# Altium footprint library CONNECTOR.PcbLib: 169 footprints (part 6 of 11)
Each footprint in its own frame and in the unit in brackets; x right, y up, seen from the top. Pads: shape width x height; smd on the part's side, far side on the other; paste and mask are expansions set on the pad; w line width, h text height; cw(c..) or ccw(c..) is an arc to the next point about the centre after c.
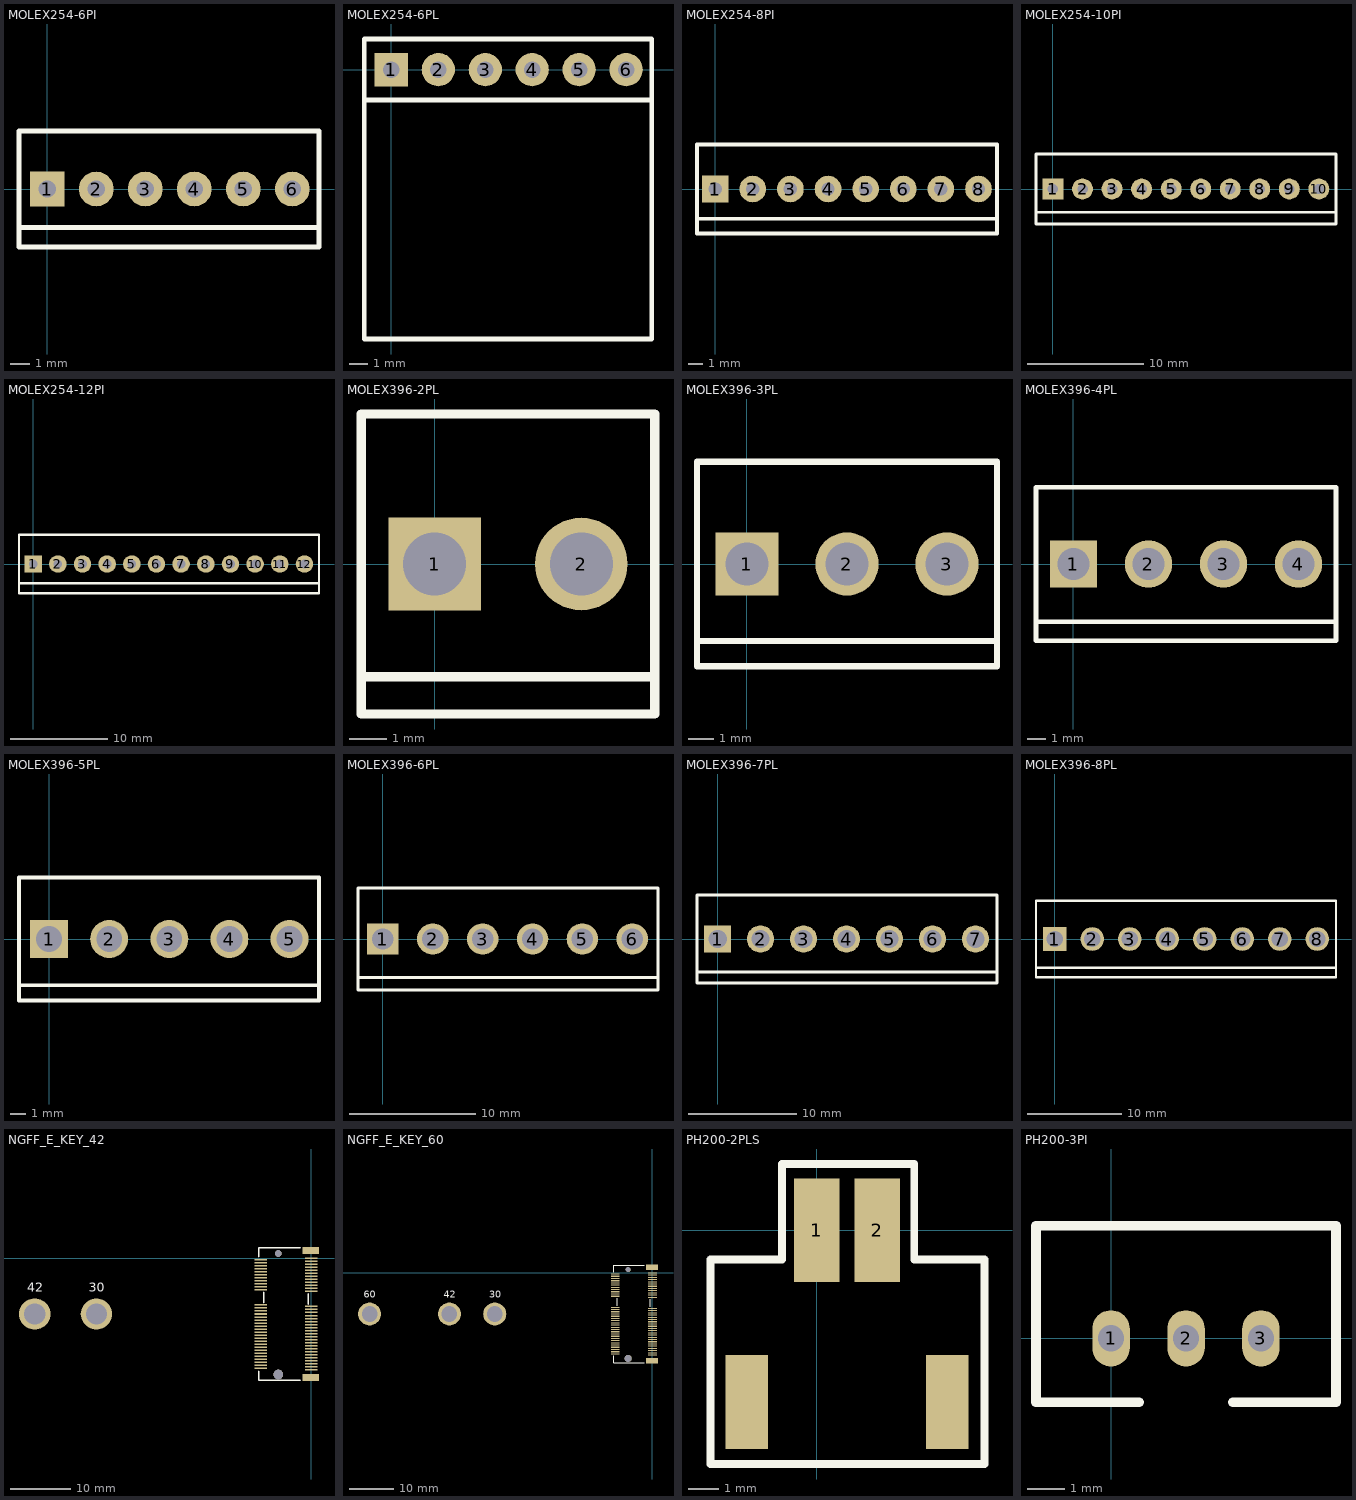
[diagram p5: the footprints below, top view; thin cyan lines are the x and y axes]

## MOLEX254-6PI [mm]
pads (6):
  rect 1.8x1.8 hole 0.9: 1(0,0)
  round 1.8 hole 0.9: 2(2.54,0) 3(5.08,0) 4(7.62,0) 5(10.16,0) 6(12.7,0)
Top Overlay:
  lines w0.25: -1.46,-2 14.08,-2 ; -1.46,-3 14.08,-3 14.08,3 -1.46,3 -1.46,-3
3D body "4384.stp": height 12.12, standoff -3.14, extent -1.251,-2.876 13.989,2.924

## MOLEX254-6PL [mm]
pads (6):
  rect 1.8x1.8 hole 0.9: 1(0,0.002)
  round 1.8 hole 0.9: 2(2.54,0.002) 3(5.08,0.002) 4(7.62,0.002) 5(10.16,0.002) 6(12.7,0.002)
Top Overlay:
  lines w0.25: -1.46,-1.641 14.08,-1.641 ; -1.46,-14.57 -1.46,1.659 14.08,1.659 14.08,-14.57 -1.46,-14.57
3D body "4310.stp": height 5.87, standoff -3.77, extent -1.298,-14.425 13.942,0.313

## MOLEX254-8PI [mm]
pads (8):
  rect 1.8x1.8 hole 0.9: 1(0,0)
  round 1.8 hole 0.9: 2(2.54,0) 3(5.08,0) 4(7.62,0) 5(10.16,0) 6(12.7,0) 7(15.24,0) 8(17.78,0)
Top Overlay:
  lines w0.25: -1.212,-2 19.024,-2 ; -1.227,-3 19.027,-3 19.027,3 -1.227,3 -1.227,-3
3D body "4386.stp": height 11.12, standoff -4.14, extent -1.279,-2.879 19.041,2.921

## MOLEX254-10PI [mm]
pads (10):
  rect 1.8x1.8 hole 0.9: 1(0,0)
  round 1.8 hole 0.9: 2(2.54,0) 3(5.08,0) 4(7.62,0) 5(10.16,0) 6(12.7,0) 7(15.24,0) 8(17.78,0) 9(20.32,0) 10(22.86,0)
Top Overlay:
  lines w0.25: -1.46,-2 24.333,-2 ; 24.282,3 -1.46,3 -1.46,-3 24.333,-3 24.333,3
3D body "4388.stp": height 12.12, standoff -3.14, extent -1.29,-2.924 24.11,2.876

## MOLEX254-12PI [mm]
pads (12):
  rect 1.8x1.8 hole 0.9: 1(0,0)
  round 1.8 hole 0.9: 2(2.54,0) 3(5.08,0) 4(7.62,0) 5(10.16,0) 6(12.7,0) 7(15.24,0) 8(17.78,0) 9(20.32,0) 10(22.86,0) 11(25.4,0) 12(27.94,0)
Top Overlay:
  lines w0.25: -1.397,-2 29.413,-2 ; -1.46,-3 29.439,-3 29.439,3 -1.46,3 -1.46,-3
3D body "4390.stp": height 12.12, standoff -3.14, extent -1.263,-2.883 29.217,2.917

## MOLEX396-2PL [mm]
pads (2):
  rect 2.5x2.5 hole 1.7: 1(0,0)
  round 2.5 hole 1.7: 2(3.96,0)
Top Overlay:
  lines w0.254: -1.98,-3.048 5.941,-3.048 ; -1.98,-4.05 5.94,-4.05 5.94,4.05 -1.98,4.05 -1.98,-4.05
3D body "41791-0832.stp": height 14.83, standoff -3.46, extent -1.963,-4.887 5.809,5.121

## MOLEX396-3PL [mm]
pads (3):
  rect 2.5x2.5 hole 1.7: 1(0,0)
  round 2.5 hole 1.7: 2(3.96,0) 3(7.92,0)
Top Overlay:
  lines w0.254: -1.98,-3.048 9.901,-3.048 ; -1.98,-4.05 9.9,-4.05 9.9,4.05 -1.98,4.05 -1.98,-4.05
3D body "26-61-4030.stp": height 14.83, standoff -3.46, extent -1.918,-4.929 9.817,5.079

## MOLEX396-4PL [mm]
pads (4):
  rect 2.5x2.5 hole 1.7: 1(0,0)
  round 2.5 hole 1.7: 2(3.96,0) 3(7.92,0) 4(11.88,0)
Top Overlay:
  lines w0.254: -1.836,-3.048 13.861,-3.048 ; -1.98,-4.05 -1.98,4.05 13.86,4.05 13.86,-4.05 -1.98,-4.05
3D body "41791-0834.stp": height 14.83, standoff -3.46, extent -1.917,-4.868 13.78,5.14

## MOLEX396-5PL [mm]
pads (5):
  rect 2.5x2.5 hole 1.7: 1(0,0)
  round 2.5 hole 1.7: 2(3.96,0) 3(7.92,0) 4(11.88,0) 5(15.84,0)
Top Overlay:
  lines w0.254: -1.98,-3.048 17.78,-3.048 ; -1.98,-4.05 -1.98,4.05 17.78,4.05 17.78,-4.05 -1.98,-4.05

## MOLEX396-6PL [mm]
pads (6):
  rect 2.5x2.5 hole 1.7: 1(0,0)
  round 2.5 hole 1.7: 2(3.96,0) 3(7.92,0) 4(11.88,0) 5(15.84,0) 6(19.8,0)
Top Overlay:
  lines w0.254: -1.98,-3.048 21.844,-3.048 ; -1.98,-4.05 21.844,-4.05 21.844,4.05 -1.98,4.05 -1.98,-4.05

## MOLEX396-7PL [mm]
pads (7):
  rect 2.5x2.5 hole 1.7: 1(0,0)
  round 2.5 hole 1.7: 2(3.96,0) 3(7.92,0) 4(11.88,0) 5(15.84,0) 6(19.8,0) 7(23.76,0)
Top Overlay:
  lines w0.254: -1.89,-3.048 25.74,-3.048 ; -1.89,-4.05 25.74,-4.05 25.74,4.05 -1.89,4.05 -1.89,-4.05
3D body "1744057-7.stp": height 11.51, standoff -3.09, extent -1.983,-3.804 25.737,4.795

## MOLEX396-8PL [mm]
pads (8):
  rect 2.5x2.5 hole 1.7: 1(0,0)
  round 2.5 hole 1.7: 2(3.96,0) 3(7.92,0) 4(11.88,0) 5(15.84,0) 6(19.8,0) 7(23.76,0) 8(27.72,0)
Top Overlay:
  lines w0.254: -1.98,-3.048 29.7,-3.048 ; -1.98,-4.05 29.7,-4.05 29.7,4.05 -1.98,4.05 -1.98,-4.05

## NGFF_E_KEY_42 [mm]
pads (73):
  rect 2x0.25 smd mask+0.102: 1(0,0) 2(-8.35,-0.25) 3(0,-0.5) 4(-8.35,-0.75) 5(0,-1) 6(-8.35,-1.25) 7(0,-1.5) 8(-8.35,-1.75) 9(0,-2) 10(-8.35,-2.25) 11(0,-2.5) 12(-8.35,-2.75) 13(0,-3) 14(-8.35,-3.25) 15(0,-3.5) 16(-8.35,-3.75) 17(0,-4) 18(-8.35,-4.25) 19(0,-4.5) 20(-8.35,-4.75) 21(0,-5) 22(-8.35,-5.25) 23(0,-5.5) 32(-8.35,-7.75) 33(0,-8) 34(-8.35,-8.25) 35(0,-8.5) 36(-8.35,-8.75) 37(0,-9) 38(-8.35,-9.25) 39(0,-9.5) 40(-8.35,-9.75) 41(0,-10) 42(-8.35,-10.25) 43(0,-10.5) 44(-8.35,-10.75) 45(0,-11) 46(-8.35,-11.25) 47(0,-11.5) 48(-8.35,-11.75) 49(0,-12) 50(-8.35,-12.25) 51(0,-12.5) 52(-8.35,-12.75) 53(0,-13) 54(-8.35,-13.25) 55(0,-13.5) 56(-8.35,-13.75) 57(0,-14) 58(-8.35,-14.25) 59(0,-14.5) 60(-8.35,-14.75) 61(0,-15) 62(-8.35,-15.25) 63(0,-15.5) 64(-8.35,-15.75) 65(0,-16) 66(-8.35,-16.25) 67(0,-16.5) 68(-8.35,-16.75) 69(0,-17) 70(-8.35,-17.25) 71(0,-17.5) 72(-8.35,-17.75) 73(0,-18) 74(-8.35,-18.25) 75(0,-18.5)
  round 5.2 hole 3.5 mask+0.102: ""(-45.7,-9.25) ""(-35.5,-9.25)
  round 1.6 hole 1.6 mask+0.102: ""(-5.45,-19.25)
  round 1.1 hole 1.1 mask+0.102: ""(-5.45,0.75)
  rect 2.75x1.2 smd mask+0.102: ""(-0.1,-19.75) ""(-0.1,1.25)
Top Overlay:
  lines w0.254: -8.7,-18.7 -8.7,-20.2 -1.8,-20.2 ; -8.7,0.2 -8.7,1.7 -1.8,1.7 ; -7.85,-7.35 -7.85,-5.65 ; -0.5,-7.6 -0.5,-5.9
  text "30" at -36.77,-5.546 h1.52
  text "42" at -46.97,-5.546 h1.52
3D body "123A-21E00_C_1.STEP": height 2.05, standoff -0.7, extent -8.5,-20.05 0.1,1.55

## NGFF_E_KEY_60 [mm]
pads (74):
  rect 2x0.25 smd mask+0.102: 1(0,0) 2(-8.35,-0.25) 3(0,-0.5) 4(-8.35,-0.75) 5(0,-1) 6(-8.35,-1.25) 7(0,-1.5) 8(-8.35,-1.75) 9(0,-2) 10(-8.35,-2.25) 11(0,-2.5) 12(-8.35,-2.75) 13(0,-3) 14(-8.35,-3.25) 15(0,-3.5) 16(-8.35,-3.75) 17(0,-4) 18(-8.35,-4.25) 19(0,-4.5) 20(-8.35,-4.75) 21(0,-5) 22(-8.35,-5.25) 23(0,-5.5) 32(-8.35,-7.75) 33(0,-8) 34(-8.35,-8.25) 35(0,-8.5) 36(-8.35,-8.75) 37(0,-9) 38(-8.35,-9.25) 39(0,-9.5) 40(-8.35,-9.75) 41(0,-10) 42(-8.35,-10.25) 43(0,-10.5) 44(-8.35,-10.75) 45(0,-11) 46(-8.35,-11.25) 47(0,-11.5) 48(-8.35,-11.75) 49(0,-12) 50(-8.35,-12.25) 51(0,-12.5) 52(-8.35,-12.75) 53(0,-13) 54(-8.35,-13.25) 55(0,-13.5) 56(-8.35,-13.75) 57(0,-14) 58(-8.35,-14.25) 59(0,-14.5) 60(-8.35,-14.75) 61(0,-15) 62(-8.35,-15.25) 63(0,-15.5) 64(-8.35,-15.75) 65(0,-16) 66(-8.35,-16.25) 67(0,-16.5) 68(-8.35,-16.75) 69(0,-17) 70(-8.35,-17.25) 71(0,-17.5) 72(-8.35,-17.75) 73(0,-18) 74(-8.35,-18.25) 75(0,-18.5)
  round 5.2 hole 3.5 mask+0.102: ""(-63.7,-9.25) ""(-45.7,-9.25) ""(-35.5,-9.25)
  round 1.6 hole 1.6 mask+0.102: ""(-5.45,-19.25)
  round 1.1 hole 1.1 mask+0.102: ""(-5.45,0.75)
  rect 2.75x1.2 smd mask+0.102: ""(-0.1,-19.75) ""(-0.1,1.25)
Top Overlay:
  lines w0.254: -8.7,-18.7 -8.7,-20.2 -1.8,-20.2 ; -8.7,0.2 -8.7,1.7 -1.8,1.7 ; -7.85,-7.35 -7.85,-5.65 ; -0.5,-7.6 -0.5,-5.9
  text "60" at -64.97,-5.546 h1.52
  text "42" at -46.97,-5.546 h1.52
  text "30" at -36.77,-5.546 h1.52
3D body "123A-21E00_C_1.STEP": height 2.05, standoff -0.7, extent -8.5,-20.05 0.1,1.55

## PH200-2PLS [mm]
pads (4):
  rect 1.5x3.4 smd: 1(0,0) 2(2,0)
  rect 1.4x3.1 smd: ""(-2.3,-5.65) ""(4.297,-5.653)
Top Overlay:
  lines w0.254: -3.492,-7.691 5.519,-7.691 5.519,-0.961 3.213,-0.961 3.213,2.177 -1.141,2.177 -1.141,-0.961 -3.492,-0.961 -3.492,-7.691
3D body "1734827-2.stp": height 5.75, standoff 0.15, extent -2.969,-7.122 5.032,1.478

## PH200-3PI [mm]
pads (3):
  oval 1x1.5 hole 0.7: 1(0,0) 2(2,0) 3(4,0)
Top Overlay:
  lines w0.254: 0.75,-1.7 -2,-1.7 -2,3 6,3 6,-1.7 3.25,-1.7